# Altium footprint library PCB_IC.PcbLib: 84 footprints (part 1 of 6)
Each footprint in its own frame and in the unit in brackets; x right, y up, seen from the top. Pads: shape width x height; smd on the part's side, far side on the other; paste and mask are expansions set on the pad; w line width, h text height; cw(c..) or ccw(c..) is an arc to the next point about the centre after c.
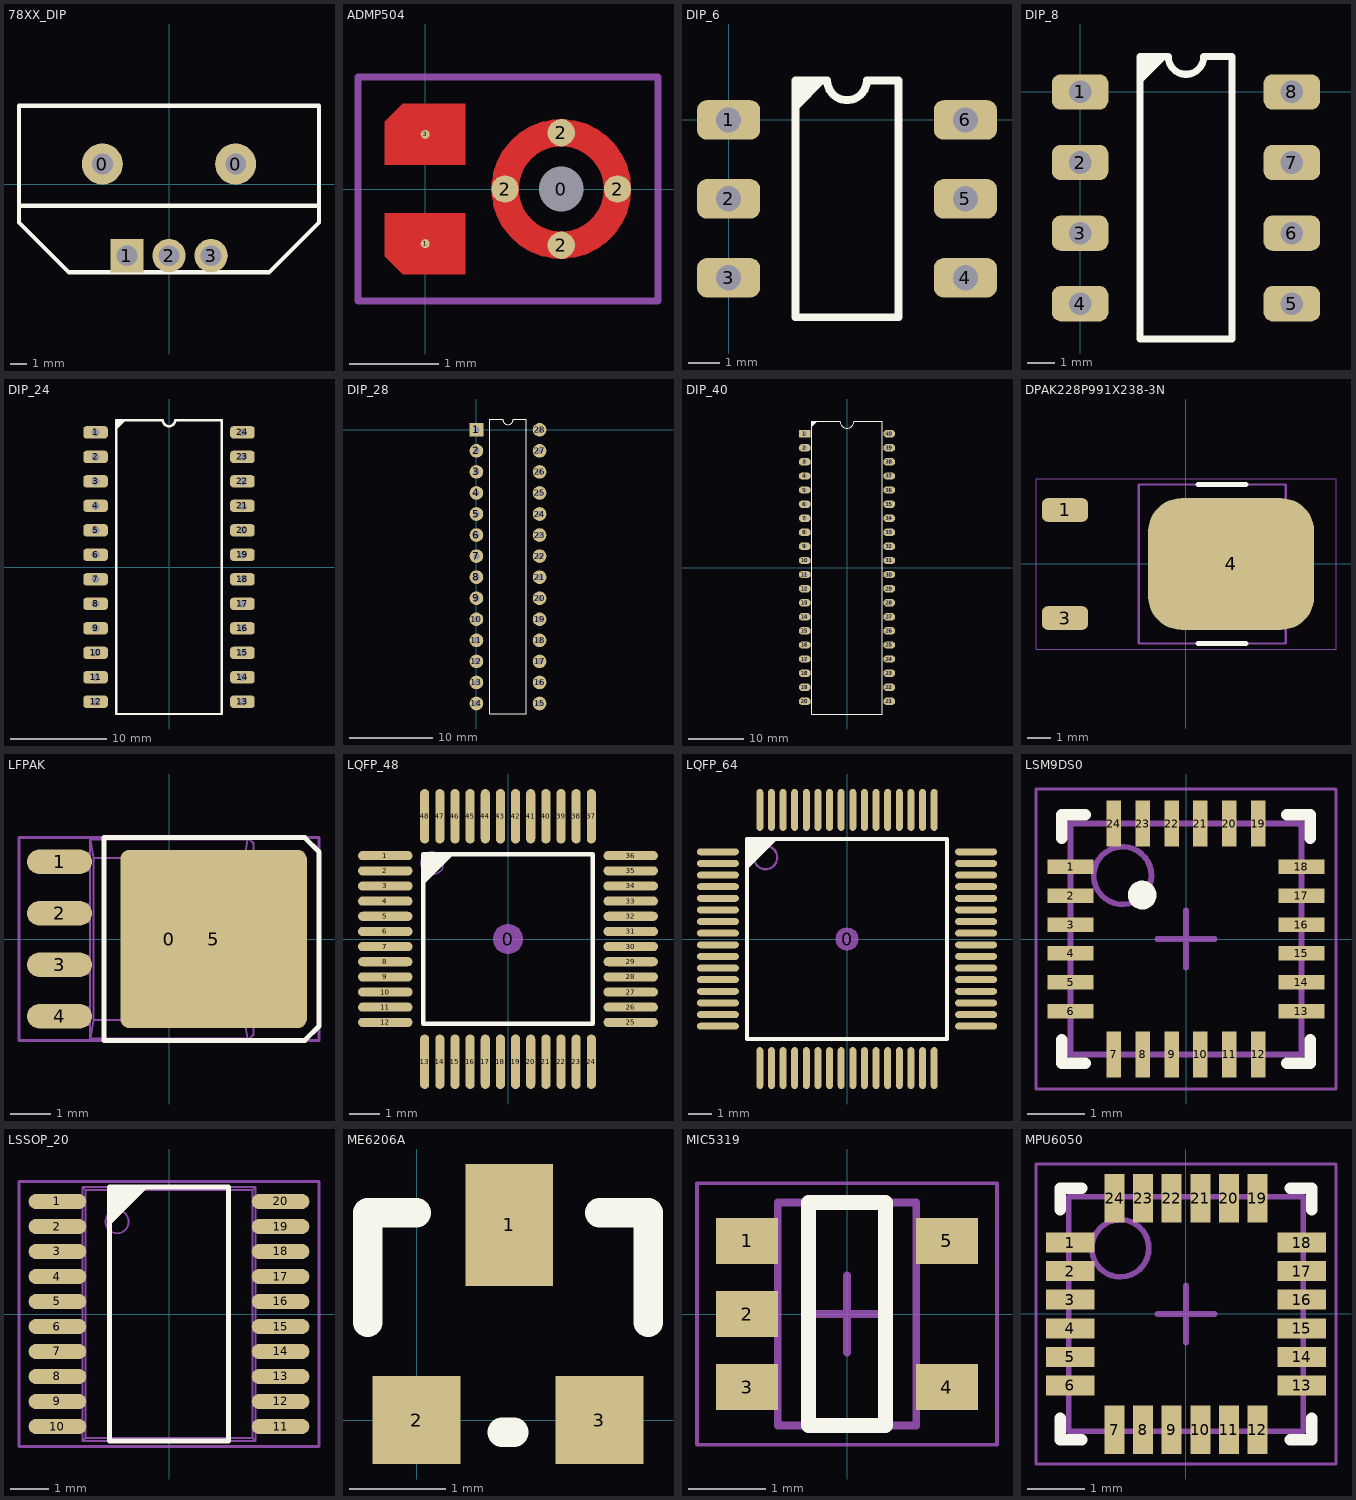
[diagram p0: the footprints below, top view; thin cyan lines are the x and y axes]

## 78XX_DIP [mil]
pads (5):
  round 98.42 hole 50: 0(-160,48) 0(160,48)
  rect 80x80 hole 50: 1(-101,-172)
  round 80 hole 50: 2(0,-172) 3(101,-172)
Top Overlay:
  lines w10: -360,-52 360,-52 ; -360,-92 -240,-212 240,-212 360,-92 360,188 -360,188 -360,-92
3D body: height 1159.52, standoff -245.89, extent -607.83,-592.95 600.33,597.26

## ADMP504 [mm] "ADMP504 MEMS MICROPHONE"
pads (7):
  round 0.4 hole 0.5 unplated: 0(1.52,0)
  round 0.1 smd mask+0: 1(0,-0.61) 3(0,0.61)
  round 0.305 smd mask+0: 2(0.892,0) 2(1.52,-0.628) 2(1.52,0.628) 2(2.148,0)
Top Layer:
  circle w0.305: c1.52,0 r0.628
  region: -0.25,0.95 -0.45,0.75 -0.45,0.27 0.45,0.27 0.45,0.95
  region: -0.45,-0.27 -0.45,-0.75 -0.25,-0.95 0.45,-0.95 0.45,-0.27
Top Solder:
  circle w0.305: c1.52,0 r0.628
  region: -0.45,0.75 -0.45,0.27 0.45,0.27 0.45,0.95 -0.25,0.95
  region: -0.45,-0.75 -0.45,-0.27 0.45,-0.27 0.45,-0.95 -0.25,-0.95
Mechanical 1:
  lines w0.076: -0.75,-1.25 1.52,-1.25 2.6,-1.25 2.6,0 2.6,1.25 1.52,1.25 -0.75,1.25 -0.75,0.61 -0.75,-1.25
3D body: height 0.98, standoff -0.01, extent -0.824,-1.286 2.604,1.294

## DIP_6 [mil]
pads (6):
  rrect50% 80x50 hole 32: 1(0,0) 2(0,-100) 3(0,-200) 4(300,-200) 5(300,-100) 6(300,0)
Top Overlay:
  region: 85,50 124.37,50 85,10.63
  lines w10: 85,-250 215,-250 215,50 175,50 cw(c150,50) 125,50 85,50 85,-250
3D body: height 210, standoff -95, extent -5,-250 305,50

## DIP_8 [mil]
pads (8):
  rrect50% 80x50 hole 32: 1(0,0) 2(0,-100) 3(0,-200) 4(0,-300) 5(300,-300) 6(300,-200) 7(300,-100) 8(300,0)
Top Overlay:
  region: 85,50 124.37,50 85,10.63
  lines w10: 85,-350 215,-350 215,50 175,50 cw(c150,50) 125,50 85,50 85,-350
3D body: height 210, standoff -95, extent -5,-350 305,50

## DIP_24 [mil]
pads (24):
  rrect50% 100x50 hole 32: 1(-300,550) 2(-300,450) 3(-300,350) 4(-300,250) 5(-300,150) 6(-300,50) 7(-300,-50) 8(-300,-150) 9(-300,-250) 10(-300,-350) 11(-300,-450) 12(-300,-550) 13(300,-550) 14(300,-450) 15(300,-350) 16(300,-250) 17(300,-150) 18(300,-50) 19(300,50) 20(300,150) 21(300,250) 22(300,350) 23(300,450) 24(300,550)
Top Overlay:
  region: -215,600 -175.63,600 -215,560.63
  lines w10: -215,-600 215,-600 215,600 25,600 cw(c0,600) -25,600 -215,600 -215,-600
3D body: height 210, standoff -95, extent -305,-600 305,600

## DIP_28 [mil]
pads (28):
  rect 65x65 hole 30: 1(0,0)
  round 65 hole 30: 2(0,-100) 3(0,-200) 4(0,-300) 5(0,-400) 6(0,-500) 7(0,-600) 8(0,-700) 9(0,-800) 10(0,-900) 11(0,-1000) 12(0,-1100) 13(0,-1200) 14(0,-1300) 15(300,-1300) 16(300,-1200) 17(300,-1100) 18(300,-1000) 19(300,-900) 20(300,-800) 21(300,-700) 22(300,-600) 23(300,-500) 24(300,-400) 25(300,-300) 26(300,-200) 27(300,-100) 28(300,0)
Top Overlay:
  lines w5: 62.5,-1350 237.5,-1350 237.5,50 175,50 cw(c150,50) 125,50 62.5,50 62.5,-1350
3D body: height 65, standoff -180, extent -3.42,-1358.9 306.57,56.1

## DIP_40 [mil]
pads (40):
  rect 80x52 hole 32: 1(-300,950)
  oct 80x52 hole 32: 2(-300,850) 3(-300,750) 4(-300,650) 5(-300,550) 6(-300,450) 7(-300,350) 8(-300,250) 9(-300,150) 10(-300,50) 11(-300,-50) 12(-300,-150) 13(-300,-250) 14(-300,-350) 15(-300,-450) 16(-300,-550) 17(-300,-650) 18(-300,-750) 19(-300,-850) 20(-300,-950) 21(300,-950) 22(300,-850) 23(300,-750) 24(300,-650) 25(300,-550) 26(300,-450) 27(300,-350) 28(300,-250) 29(300,-150) 30(300,-50) 31(300,50) 32(300,150) 33(300,250) 34(300,350) 35(300,450) 36(300,550) 37(300,650) 38(300,750) 39(300,850) 40(300,950)
Top Overlay:
  region: -250,1040 -210.63,1040 -250,1000.63
  lines w6: -250,-1040 250,-1040 250,1040 50,1040 cw(c0,1040) -50,1040 -250,1040 -250,-1040
3D body: height 210, standoff -95, extent -305,-1000 305,1000

## DPAK228P991X238-3N [mm] "D-PAK, 3-Pads, Body 6.20x6.72mm (max), IPC Medium Density"
height 2.38
pads (3):
  rrect50% 1.95x1 smd: 1(-5.1,2.28) 3(-5.1,-2.28)
  rrect50% 7x5.55 smd: 4(1.905,0)
Top Overlay:
  lines w0.2: 0.508,-3.35 2.54,-3.35 ; 0.508,3.35 2.54,3.35
Mechanical 13:
  lines w0.1: -2,-3.35 4.2,-3.35 4.2,3.35 -2,3.35 -2,-3.35
Mechanical 15:
  lines w0.05: -6.325,-3.6 6.325,-3.6 6.325,3.6 -6.325,3.6 -6.325,-3.6
  lines w0.1: -0.5,0 0.5,0 ; 0,-0.5 0,0.5
3D body: height 2.31, standoff 0, extent -5.348,-3.3 4.365,3.3

## LFPAK [mm] "Renesas LFPAK, a variant of SOIC-8; IPC Medium Density"
height 1.1
pads (6):
  round 1 on Mech14: 0(0,0)
  oval 1.6x0.6 smd: 1(-2.7,1.905) 2(-2.7,0.635) 3(-2.7,-0.635) 4(-2.7,-1.905)
  rrect10% 4.6x4.4 smd paste-0.8: 5(1.1,0)
Top Overlay:
  lines w0.127: -1.6,-2.5 -1.6,2.5 3.35,2.5 3.7,2.15 3.7,-2.15 3.35,-2.5 -1.6,-2.5
Mechanical 13:
  circle w0.05: c0,1.5 r0.338
  lines w0.05: -2.631,-2.115 -2.631,-1.695 ; -2.631,-0.845 -2.631,-0.425 ; -2.631,0.425 -2.631,0.845 ; -2.631,1.695 -2.631,2.115 ; -2.543,-2.115 -2.543,-1.695 ; -2.543,-0.845 -2.543,-0.425 ; -2.543,0.425 -2.543,0.845 ; -2.543,1.695 -2.543,2.115 ; -2.506,-2.115 -2.506,-1.695 ; -2.506,-0.845 -2.506,-0.425 ; -2.506,0.425 -2.506,0.845 ; -2.506,1.695 -2.506,2.115 ; -2.217,-2.115 -2.217,-1.695 ; -2.217,-0.845 -2.217,-0.425 ; -2.217,0.425 -2.217,0.845 ; -2.217,1.695 -2.217,2.115 ; -1.95,-2.115 -3,-2.115 -3,-1.695 -1.95,-1.695 ; -1.95,-0.845 -3,-0.845 -3,-0.425 -1.95,-0.425 ; -1.95,0.425 -3,0.425 -3,0.845 -1.95,0.845 ; -1.95,1.695 -3,1.695 -3,2.115 -1.95,2.115 ; -1.937,-2.45 -1.858,-2.003 ; -1.937,2.45 -1.858,2.003 ; 1.937,-2.45 1.858,-2.003 ; 1.937,2.45 1.858,2.003 ; 2.085,-1.4 2.085,-2.358 1.993,-2.45 -1.95,-2.45 -1.95,2.45 1.993,2.45 2.085,2.358 2.085,1.4 ; 2.085,-0.6 2.085,0.6 ; -1.858,-2.003 -1.858,2.003 ; -1.858,-2.003 1.858,-2.003 ; -1.858,2.003 1.858,2.003 ; 1.858,-2.003 1.858,2.003 ; 2.028,-1.4 2.3,-1.4 2.3,-2.1 2.55,-2.1 3,-1.65 3,1.65 2.55,2.1 2.3,2.1 2.3,1.4 2.028,1.4 2.028,0.6 2.1,0.6 2.1,-0.6 2.028,-0.6 2.028,-1.4
Mechanical 14:
  lines w0.076: -3.7,-2.5 -3.7,2.5 3.7,2.5 3.7,-2.5 -3.7,-2.5
3D body: height 1.1, standoff 0, extent -3,-2.45 3,2.45

## LQFP_48 [mm] "Thin QFP, 48-Leads, Body 7x7mm, Pitch 0.5mm, IPC Medium Density"
height 1.6
pads (49):
  round 1 on Mech14: 0(0,0)
  oval 1.8x0.3 smd: 1(-4.05,2.75) 2(-4.05,2.25) 3(-4.05,1.75) 4(-4.05,1.25) 5(-4.05,0.75) 6(-4.05,0.25) 7(-4.05,-0.25) 8(-4.05,-0.75) 9(-4.05,-1.25) 10(-4.05,-1.75) 11(-4.05,-2.25) 12(-4.05,-2.75) 25(4.05,-2.75) 26(4.05,-2.25) 27(4.05,-1.75) 28(4.05,-1.25) 29(4.05,-0.75) 30(4.05,-0.25) 31(4.05,0.25) 32(4.05,0.75) 33(4.05,1.25) 34(4.05,1.75) 35(4.05,2.25) 36(4.05,2.75)
  oval 0.3x1.8 smd: 13(-2.75,-4.05) 14(-2.25,-4.05) 15(-1.75,-4.05) 16(-1.25,-4.05) 17(-0.75,-4.05) 18(-0.25,-4.05) 19(0.25,-4.05) 20(0.75,-4.05) 21(1.25,-4.05) 22(1.75,-4.05) 23(2.25,-4.05) 24(2.75,-4.05) 37(2.75,4.05) 38(2.25,4.05) 39(1.75,4.05) 40(1.25,4.05) 41(0.75,4.05) 42(0.25,4.05) 43(-0.25,4.05) 44(-0.75,4.05) 45(-1.25,4.05) 46(-1.75,4.05) 47(-2.25,4.05) 48(-2.75,4.05)
Top Overlay:
  region: -2.794,2.794 -1.794,2.794 -2.794,1.794
  lines w0.152: -2.794,-2.794 -2.794,2.794 2.794,2.794 2.794,-2.794 -2.794,-2.794
Mechanical 13:
  circle w0.05: c-2.5,2.5 r0.375
3D body: height 1.59, standoff -0.01, extent -4.5,-4.5 4.5,4.5

## LQFP_64 [mm] "Thin Quad Flat Pack, 64 pins, 0.5mm pitch, 12mm lead span, body 10x10mm, 0.1mm body height, max tolerances, IPC Medium Density"
height 1.6
pads (65):
  round 1 on Mech14: 0(0,0)
  oval 1.8x0.3 smd: 1(-5.55,3.75) 2(-5.55,3.25) 3(-5.55,2.75) 4(-5.55,2.25) 5(-5.55,1.75) 6(-5.55,1.25) 7(-5.55,0.75) 8(-5.55,0.25) 9(-5.55,-0.25) 10(-5.55,-0.75) 11(-5.55,-1.25) 12(-5.55,-1.75) 13(-5.55,-2.25) 14(-5.55,-2.75) 15(-5.55,-3.25) 16(-5.55,-3.75) 33(5.55,-3.75) 34(5.55,-3.25) 35(5.55,-2.75) 36(5.55,-2.25) 37(5.55,-1.75) 38(5.55,-1.25) 39(5.55,-0.75) 40(5.55,-0.25) 41(5.55,0.25) 42(5.55,0.75) 43(5.55,1.25) 44(5.55,1.75) 45(5.55,2.25) 46(5.55,2.75) 47(5.55,3.25) 48(5.55,3.75)
  oval 0.3x1.8 smd: 17(-3.75,-5.55) 18(-3.25,-5.55) 19(-2.75,-5.55) 20(-2.25,-5.55) 21(-1.75,-5.55) 22(-1.25,-5.55) 23(-0.75,-5.55) 24(-0.25,-5.55) 25(0.25,-5.55) 26(0.75,-5.55) 27(1.25,-5.55) 28(1.75,-5.55) 29(2.25,-5.55) 30(2.75,-5.55) 31(3.25,-5.55) 32(3.75,-5.55) 49(3.75,5.55) 50(3.25,5.55) 51(2.75,5.55) 52(2.25,5.55) 53(1.75,5.55) 54(1.25,5.55) 55(0.75,5.55) 56(0.25,5.55) 57(-0.25,5.55) 58(-0.75,5.55) 59(-1.25,5.55) 60(-1.75,5.55) 61(-2.25,5.55) 62(-2.75,5.55) 63(-3.25,5.55) 64(-3.75,5.55)
Top Overlay:
  region: -4.294,4.294 -3.006,4.294 -4.294,3.006
  lines w0.152: -4.3,-4.3 -4.3,4.3 4.3,4.3 4.3,-4.3 -4.3,-4.3
Mechanical 13:
  circle w0.1: c-3.5,3.5 r0.5
  lines w0.127: -4.3,3.7 -3.7,4.3
3D body: height 1.59, standoff -0.01, extent -6.1,-6.1 6.1,6.1

## LSM9DS0 [mm]
height 1.07
pads (24):
  rect 0.8x0.25 smd: 1(-2,1.25) 2(-2,0.75) 3(-2,0.25) 4(-2,-0.25) 5(-2,-0.75) 6(-2,-1.25) 13(2,-1.25) 14(2,-0.75) 15(2,-0.25) 16(2,0.25) 17(2,0.75) 18(2,1.25)
  rect 0.25x0.8 smd: 7(-1.25,-2) 8(-0.75,-2) 9(-0.25,-2) 10(0.25,-2) 11(0.75,-2) 12(1.25,-2) 19(1.25,2) 20(0.75,2) 21(0.25,2) 22(-0.25,2) 23(-0.75,2) 24(-1.25,2)
Top Overlay:
  circle w0.25: c-0.76,0.762 r0.125
  lines w0.2: -2.15,-1.75 -2.15,-2.15 -1.75,-2.15 ; -2.15,1.75 -2.15,2.15 -1.75,2.15 ; 1.75,-2.15 2.15,-2.15 2.15,-1.75 ; 1.75,2.15 2.15,2.15 2.15,1.75
Mechanical 13:
  circle w0.1: c-1.1,1.1 r0.5
  lines w0.1: -2,-2 2,-2 2,2 -2,2 -2,-2
Mechanical 15:
  lines w0.05: -2.6,-2.6 2.6,-2.6 2.6,2.6 -2.6,2.6 -2.6,-2.6
  lines w0.1: -0.5,0 0.5,0 ; 0,-0.5 0,0.5
3D body: height 0.8, standoff 0, extent -2.032,-2.045 2.058,2.045

## LSSOP_20 [mm] "LSSOP, 20-Leads, Body 6.6x4.5mm (max), Pitch 0.65mm, IPC Medium Density"
height 1.45
pads (20):
  oval 1.5x0.4 smd paste-1 mask+0.127: 1(-2.9,2.925) 2(-2.9,2.275) 3(-2.9,1.625) 4(-2.9,0.975) 5(-2.9,0.325) 6(-2.9,-0.325) 7(-2.9,-0.975) 8(-2.9,-1.625) 9(-2.9,-2.275) 10(-2.9,-2.925) 11(2.9,-2.925) 12(2.9,-2.275) 13(2.9,-1.625) 14(2.9,-0.975) 15(2.9,-0.325) 16(2.9,0.325) 17(2.9,0.975) 18(2.9,1.625) 19(2.9,2.275) 20(2.9,2.925)
Top Overlay:
  region: -1.55,3.3 -0.55,3.3 -1.55,2.3
  lines w0.127: -1.55,-3.3 -1.55,3.3 1.55,3.3 1.55,-3.3 -1.55,-3.3
Top Paste:
  region: 3.5,-0.825 2.3,-0.825 2.3,-1.125 3.5,-1.125
  region: 3.5,-0.175 2.3,-0.175 2.3,-0.475 3.5,-0.475
  region: 3.5,0.475 2.3,0.475 2.3,0.175 3.5,0.175
  region: 3.5,1.125 2.3,1.125 2.3,0.825 3.5,0.825
  region: 3.5,1.775 2.3,1.775 2.3,1.475 3.5,1.475
  region: 3.5,2.425 2.3,2.425 2.3,2.125 3.5,2.125
  region: 3.5,3.075 2.3,3.075 2.3,2.775 3.5,2.775
  rectangle: -3.5,2.775 -2.3,3.075
  rectangle: -3.5,2.125 -2.3,2.425
  rectangle: -3.5,1.475 -2.3,1.775
  rectangle: -3.5,0.825 -2.3,1.125
  rectangle: -3.5,0.175 -2.3,0.475
  rectangle: -3.5,-0.475 -2.3,-0.175
  rectangle: -3.5,-1.125 -2.3,-0.825
  rectangle: -3.5,-3.075 -2.3,-2.775
  rectangle: -3.5,-2.425 -2.3,-2.125
  rectangle: -3.5,-1.775 -2.3,-1.475
  region: 3.5,-1.475 2.3,-1.475 2.3,-1.775 3.5,-1.775
  region: 3.5,-2.125 2.3,-2.125 2.3,-2.425 3.5,-2.425
  region: 3.5,-2.775 2.3,-2.775 2.3,-3.075 3.5,-3.075
Mechanical 13:
  drawing of 153 lines, arcs and shapes, not listed
Mechanical 14:
  lines w0.076: -3.9,-3.45 -3.9,3.45 3.9,3.45 3.9,-3.45 -3.9,-3.45
3D body: height 1.45, standoff 0, extent -3.3,-3.3 3.3,3.3

## ME6206A [mil]
pads (3):
  rect 36x50 smd: 1(38,80)
  rect 36x36 smd: 2(0,0) 3(75,0)
Top Overlay:
  lines w12: -20,40 -20,85 0,85 ; 35,-5 40,-5 ; 75,85 95,85 95,40
3D body: height 43.91, standoff 0.6, extent -22.05,-4.21 96.06,94.21

## MIC5319 [mm] "SOT23, 5-Leads, Body 2.90x2.80mm, Pitch 0.95mm, IPC Medium Density"
height 1
pads (5):
  rect 0.8x0.6 smd: 1(-1.3,0.95) 2(-1.3,0) 3(-1.3,-0.95) 4(1.3,-0.95) 5(1.3,0.95)
Top Overlay:
  lines w0.2: -0.5,-1.45 -0.5,1.45 0.5,1.45 0.5,-1.45 -0.5,-1.45
Mechanical 13:
  lines w0.1: -0.9,-1.45 0.9,-1.45 0.9,1.45 -0.9,1.45 -0.9,-1.45
Mechanical 15:
  lines w0.05: -1.95,-1.7 1.95,-1.7 1.95,1.7 -1.95,1.7 -1.95,-1.7
  lines w0.1: -0.5,0 0.5,0 ; 0,-0.5 0,0.5
3D body: height 1.44, standoff -0.01, extent -1.4,-1.45 1.4,1.45

## MPU6050 [mm] "QFN, 24-Leads, Body 4.00x4.00mm, Pitch 0.50mm, Thermal Pad 2.70x2.60mm, IPC Medium Density"
height 0.95
pads (24):
  rect 0.85x0.35 smd: 1(-2.025,1.25) 2(-2.025,0.75) 3(-2.025,0.25) 4(-2.025,-0.25) 5(-2.025,-0.75) 6(-2.025,-1.25) 13(2.025,-1.25) 14(2.025,-0.75) 15(2.025,-0.25) 16(2.025,0.25) 17(2.025,0.75) 18(2.025,1.25)
  rect 0.35x0.85 smd: 7(-1.25,-2.025) 8(-0.75,-2.025) 9(-0.25,-2.025) 10(0.25,-2.025) 11(0.75,-2.025) 12(1.25,-2.025) 19(1.25,2.025) 20(0.75,2.025) 21(0.25,2.025) 22(-0.25,2.025) 23(-0.75,2.025) 24(-1.25,2.025)
Top Overlay:
  lines w0.2: -2.2,-1.825 -2.2,-2.2 -1.825,-2.2 ; -2.2,1.825 -2.2,2.2 -1.825,2.2 ; 1.825,-2.2 2.2,-2.2 2.2,-1.825 ; 1.825,2.2 2.2,2.2 2.2,1.825
Mechanical 13:
  circle w0.1: c-1.15,1.15 r0.5
  lines w0.1: -2.05,-2.05 2.05,-2.05 2.05,2.05 -2.05,2.05 -2.05,-2.05
Mechanical 15:
  lines w0.05: -2.625,-2.625 2.625,-2.625 2.625,2.625 -2.625,2.625 -2.625,-2.625
  lines w0.1: -0.5,0 0.5,0 ; 0,-0.5 0,0.5
3D body: height 0.8, standoff 0, extent -2.045,-2.045 2.045,2.045